# Altium integrated library URC_Lib.IntLib: 69 symbols
Pins are listed as number, name and electrical type; pins without a type are passive.

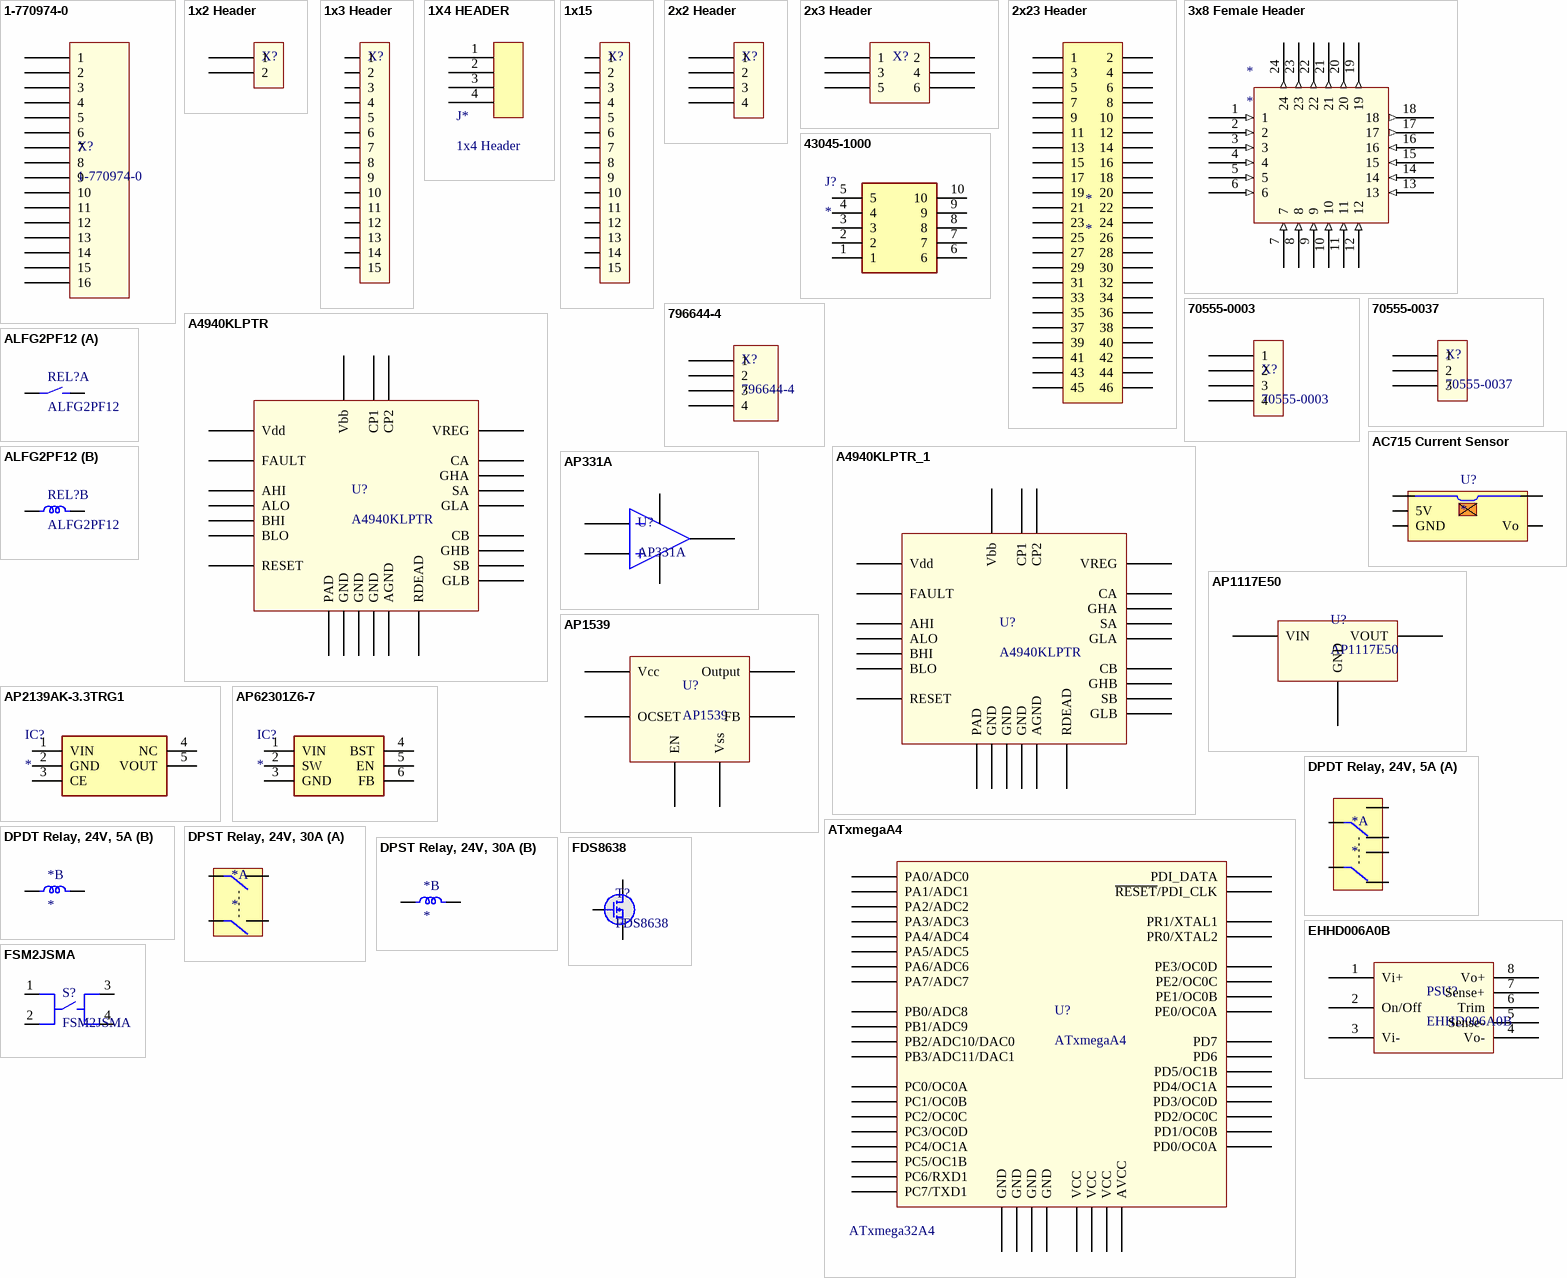
[diagram p0: symbols 1-770974-0 to FSM2JSMA]

## 1-770974-0
designator X?
Mini-Universal MATE-N-LOK, 16 pin; URL: http://search.digikey.com/us/en/products/1-770974-0/A32484-ND/697066
footprint 1-770974-0 (16 Pin Mini-Universal MATE-N-LOK)
pins: 1, 2, 3, 4, 5, 6, 7, 8, 9, 10, 11, 12, 13, 14, 15, 16

## 1x2 Header
designator X?, comment Header  (value not drawn)
1x2 Header
footprint 1x2 Header
pins: 1, 2
1 alternate drawing of the same symbol

## 1x3 Header
designator X?, comment Header  (value not drawn)
1x3 Header
footprint 1x15 Header
pins: 1, 2, 3, 4, 5, 6, 7, 8, 9, 10, 11, 12, 13, 14, 15

## 1X4 HEADER
designator J*, comment 1x4 Header
CONN HEADER VERT 4POS 2.54MM; Manufacturer: Würth Elektronik; Manufacturer Part Number: 61300411121; Value: 1x4 Header
footprint 1X4 HEADER
pins: 1, 2, 3, 4

## 1x15
designator X?, comment Header  (value not drawn)
1x3 Header
footprint 1x15 Header
pins: 1, 2, 3, 4, 5, 6, 7, 8, 9, 10, 11, 12, 13, 14, 15

## 2x2 Header
designator X?, comment Header  (value not drawn)
2x2 Header
footprint 2x2 Header
footprint 2x2 Header w/ division
pins: 1, 2, 3, 4
1 alternate drawing of the same symbol

## 2x3 Header
designator X?, comment Header  (value not drawn)
2x3 Header; Manufacturer 1: FCI; Manufacturer Part Number: 67996-406HLF; Description 1: FCI - 67996-406HLF - BOARD-BOARD CONNECTOR HEADER, 6 POSITION, 2ROW; Product Range: BergStik 67996 Series; Contact Termination Type: Through Hole; No. of Contacts: 6; Pitch Spacing: 2.54; No. of Rows: 2; Supplier 1: Newark; Supplier Part Number 1: 20M2191; RoHS: YES; Stock 1: 441; Pricing 1: 1=0.254, 10=0.218, 25=0.186, 50=0.178, 100=0.16, 250=0.153, 500=0.128, 1000=0.117 (USD); Gender: Header; Contact Plating: Tin Plated Contacts; ComponentLink1URL: http://www.farnell.com/datasheets/1876884.pdf; ComponentLink1Description: http://www.farnell.com/datasheets/1876884.pdf
footprint 2x3 Header
pins: 1, 2, 3, 4, 5, 6

## 2x23 Header
designator *
footprint 2X23 HEADER
pins: 1, 2, 3, 4, 5, 6, 7, 8, 9, 10, 11, 12, 13, 14, 15, 16, 17, 18, 19, 20, 21, 22, 23, 24, 25, 26, 27, 28, 29, 30, 31, 32, 33, 34, 35, 36, 37, 38, 39, 40, 41, 42, 43, 44, 45, 46

## 3x8 Female Header
designator *
footprint 3x8 Female Header (3x8 female header)
pins: 1 (in), 2 (in), 3 (in), 4 (in), 5 (in), 6 (in), 7 (in), 8 (in), 9 (in), 10 (in), 11 (in), 12 (in), 13 (in), 14 (in), 15 (in), 16 (in), 17 (out), 18 (out), 19 (out), 20 (out), 21 (out), 22 (out), 23 (out), 24 (out)

## 43045-1000
designator J?
Connector; Manufacturer_Name: Molex; Manufacturer_Part_Number: 43045-1000; Datasheet Link: https://componentsearchengine.com//43045-1000.pdf; Height: 8.47mm; Mouser2 Part Number: 538-43045-1000; Mouser2 Price/Stock: https://www.mouser.com/Search/Refine.aspx?Keyword=538-43045-1000
footprint 43045-1000
pins: 1, 2, 3, 4, 5, 6, 7, 8, 9, 10

## 70555-0003
designator X?
Molex, C-Grid SL 70555, 4 Pin; URL: http://search.digikey.com/us/en/products/70555-0003/WM4166-ND/1643400
footprint 70555-0003 (Molex C-Grid SL 70555, 4 Pin)
pins: 1, 2, 3, 4

## 70555-0037
designator X?
Molex, C-Grid SL 70555, 3 Pin; URL: http://search.digikey.com/us/en/products/70555-0037/WM4176-ND/1643410
footprint 70555-0037 (Molex C-Grid SL 70555, 3 Pin)
pins: 1, 2, 3

## 796644-4
designator X?
TE Connectivity, Termi-Blok, 4 Pin; URL: http://search.digikey.com/us/en/products/796644-4/A98250-ND/1827109
footprint 796644-4 (Termi-Blok, 4 Pin, R/A)
pins: 1, 2, 3, 4

## A4940KLPTR
designator U?
Full Bridge MOSFET Driver
footprint TSOP-24-TP (TSOP, 24-Leads, Body 7.8x4.4mm (max), Pitch 0.65mm, IPC Medium Density)
pins: 1 RESET, 2 GND, 3 GLB, 4 SB, 5 GHB, 6 CB, 7 VREG, 8 CA, 9 GHA, 10 SA, 11 GLA, 12 Vbb, 13 CP2, 14 CP1, 15 GND, 16 GND, 17 BLO, 18 BHI, 19 ALO, 20 AHI, 21 Vdd, 22 AGND, 23 RDEAD, 24 FAULT, 25 PAD

## A4940KLPTR_1
designator U?, comment A4940KLPTR
Full Bridge MOSFET Driver
footprint TSOP-24-TP (TSOP, 24-Leads, Body 7.8x4.4mm (max), Pitch 0.65mm, IPC Medium Density)
pins: 1 RESET, 2 GND, 3 GLB, 4 SB, 5 GHB, 6 CB, 7 VREG, 8 CA, 9 GHA, 10 SA, 11 GLA, 12 Vbb, 13 CP2, 14 CP1, 15 GND, 16 GND, 17 BLO, 18 BHI, 19 ALO, 20 AHI, 21 Vdd, 22 AGND, 23 RDEAD, 24 FAULT, 25 PAD

## AC715 Current Sensor
designator U?
Manufacturer Part Number: 1186; Supplier Unit Price 1: 9.95; Supplier Part Number 1: 1186; Supplier 1: Pololu
footprint AC715 Current Sensor
pins: 1, 2, 3 GND, 4 Vo, 5 5V

## ALFG2PF12
designator REL?
31A SPST 12V Relay; URL: http://search.digikey.com/us/en/products/ALFG2PF12/255-2638-ND/2125675
footprint ALFG2PF12
part A pins: 3, 4
part B pins: 1, 2

## AP331A
designator U?
2-36V Comparator; URL: http://search.digikey.com/us/en/products/AP331AWRG-7/AP331AWRGDICT-ND/2095606
footprint AP331AWR (SOT25R); pin to pad 1>3 3>1
pins: 1 In-, 2 GND, 3 In+, 4 OUT, 5 VCC

## AP1117E50
designator U?
5V 1A Linear Regulator; URL: https://www.digikey.com/product-detail/en/AP1117E50G-13/AP1117E50GDICT-ND/1301523
footprint AP1117 (SOT223-3L)
pins: GND, VIN, VOUT

## AP1539
designator U?
4A Switching Regulator
footprint AP1539-SOP8 (SOIC, 8-Leads, Body 4.9x3.9mm (max), Pitch 1.27mm, IPC Medium Density)
pins: EN, FB, OCSET, Output, Vcc, Vss

## AP2139AK-3.3TRG1
designator IC?
Integrated Circuit; Manufacturer_Name: Diodes Inc.; Manufacturer_Part_Number: AP2139AK-3.3TRG1; Height: 1.45mm
footprint AP2139AK-3.3TRG1 (SOT95P280X145-5N)
pins: 1 VIN, 2 GND, 3 CE, 4 NC, 5 VOUT

## AP62301Z6-7
designator IC?
Integrated Circuit; Manufacturer_Name: Diodes Inc.; Manufacturer_Part_Number: AP62301Z6-7; Datasheet Link: https://www.diodes.com/assets/Datasheets/AP62300_AP62301_AP62300T.pdf; Height: 0.6mm
footprint AP62301Z6-7 (SOTFL50P162X60-6N)
pins: 1 VIN, 2 SW, 3 GND, 4 BST, 5 EN, 6 FB

## ATxmegaA4
designator U?  Model: ATxmega32A4
URL: http://search.digikey.com/us/en/products/ATXMEGA32A4-AU/ATXMEGA32A4-AU-ND/1886270
footprint ATxmegaA4-TQFP44 (TQFP, 44-Leads, Body 12.3x12.3mm (max), Pitch 0.80mm, IPC Medium Density)
pins: 1 PA5/ADC5, 2 PA6/ADC6, 3 PA7/ADC7, 4 PB0/ADC8, 5 PB1/ADC9, 6 PB2/ADC10/DAC0, 7 PB3/ADC11/DAC1, 8 GND, 9 VCC, 10 PC0/OC0A, 11 PC1/OC0B, 12 PC2/OC0C, 13 PC3/OC0D, 14 PC4/OC1A, 15 PC5/OC1B, 16 PC6/RXD1, 17 PC7/TXD1, 18 GND, 19 VCC, 20 PD0/OC0A, 21 PD1/OC0B, 22 PD2/OC0C, 23 PD3/OC0D, 24 PD4/OC1A, 25 PD5/OC1B, 26 PD6, 27 PD7, 28 PE0/OC0A, 29 PE1/OC0B, 30 GND, 31 VCC, 32 PE2/OC0C, 33 PE3/OC0D, 34 PDI_DATA, 35 ~{RESET}/PDI_CLK, 36 PR0/XTAL2, 37 PR1/XTAL1, 38 GND, 39 AVCC, 40 PA0/ADC0, 41 PA1/ADC1, 42 PA2/ADC2, 43 PA3/ADC3, 44 PA4/ADC4

## DPDT Relay, 24V, 5A
designator *
Vender URL: https://www.digikey.com/product-detail/en/JW2SN-DC24V/255-1118-ND/251890
footprint JW2SN-DC24V (24V Relay by panasonic)
part A pins: 2, 3, 4, 5, 6, 7
part B pins: 1, 8

## DPST Relay, 24V, 30A
designator *
Vender URL: http://www.digikey.com/product-search/en?KeyWords=T92P7D12-24&WT.z_header=search_go
footprint T92 Series Relay
part A pins: 2, 4, 6, 8
part B pins: 0, 1

## EHHD006A0B
designator PSU?
12V DC-DC Converter, Eighth-Brick; Supplier 1: Digi-Key; Supplier 2: Digi-Key; Supplier Part Number 1: 555-1279-ND; Supplier Part Number 2: 555-1265-ND; URL: http://search.digikey.com/us/en/products/EHHD006A0B41Z/555-1265-ND/2704888
footprint EHHD006A0B
pins: 1 Vi+ (power), 2 On/Off, 3 Vi- (power), 4 Vo- (power), 5 Sense-, 6 Trim, 7 Sense+, 8 Vo+ (power)

## FDS8638
designator T?
Power N-Channel MOSFET
footprint FDS8638 (SOIC, 8-Leads, Body 5.0x4.0mm (max), Pitch 1.27mm, IPC Medium Density)
pins: D DRAIN, G GATE, S SOURCE

## FSM2JSMA
designator S?
Tactile Switch (OFF-MOM); Manufacturer 1: TE CONNECTIVITY / ALCOSWITCH; Description 1: TE CONNECTIVITY / ALCOSWITCH - FSM2JSMA - SWITCH, TACTILE, SPST-NO, 50mA, SMD; URL: http://search.digikey.com/us/en/products/FSM2JSMA/450-1130-ND/525819; Supplier 1: Newark; Supplier Part Number 1: 92F2864; RoHS: YES; Stock 1: 73; Pricing 1: 1=0.28, 10=0.262, 25=0.253, 50=0.244, 100=0.23, 250=0.217, 500=0.208, 1000=0.158 (USD); ComponentLink1URL: http://www.tycoelectronics.com/commerce/DocumentDelivery/DDEController?Action=showdoc&DocId=Catalog+Section%7F1308111-1_SWITCHES_CORE_PROGRAM_CATALOG%7F0308%7Fpdf%7FEnglish%7FENG_CS_1308111-1_SWITCHES_CORE_PROGRAM_CATALOG_0308.pdf%7F1825041-1; ComponentLink1Description: http://www.tycoelectronics.com/commerce/DocumentDelivery/DDEController?Action=showdoc&DocId=Catalog+Section%7F1308111-1_SWITCHES_CORE_PROGRAM_CATALOG%7F0308%7Fpdf%7FEnglish%7FENG_CS_1308111-1_SWITCHES_CORE_PROGRAM_CATALOG_0308.pdf%7F1825041-1; ComponentLink2URL: http://www.farnell.com/cad/1650702.pdf; ComponentLink2Description: http://www.farnell.com/cad/1650702.pdf; ComponentLink3URL: http://www.farnell.com/datasheets/1668117.pdf; ComponentLink3Description: http://www.farnell.com/datasheets/1668117.pdf; ComponentLink4URL: http://www.farnell.com/datasheets/921681.pdf; ComponentLink4Description: http://www.farnell.com/datasheets/921681.pdf; ComponentLink5URL: http://ecommas.tycoelectronics.com/commerce/DocumentDelivery/DDEController?Action=showdoc&DocId=Catalog+Page%7F1308390_0904_E3_E10%7Fn%2Fa%7Fpdf%7FEnglish%7FENG_CAT_1308390_0904_E3_E10_.pdf; ComponentLink5Description: http://ecommas.tycoelectronics.com/commerce/DocumentDelivery/DDEController?Action=showdoc&DocId=Catalog+Page%7F1308390_0904_E3_E10%7Fn%2Fa%7Fpdf%7FEnglish%7FENG_CAT_1308390_0904_E3_E10_.pdf; Manufacturer Part Number: FSM2JSMA
footprint FSM2JSMA (SPST OFF-MOM Switch)
pins: 1, 2, 3, 4
1 alternate drawing of the same symbol

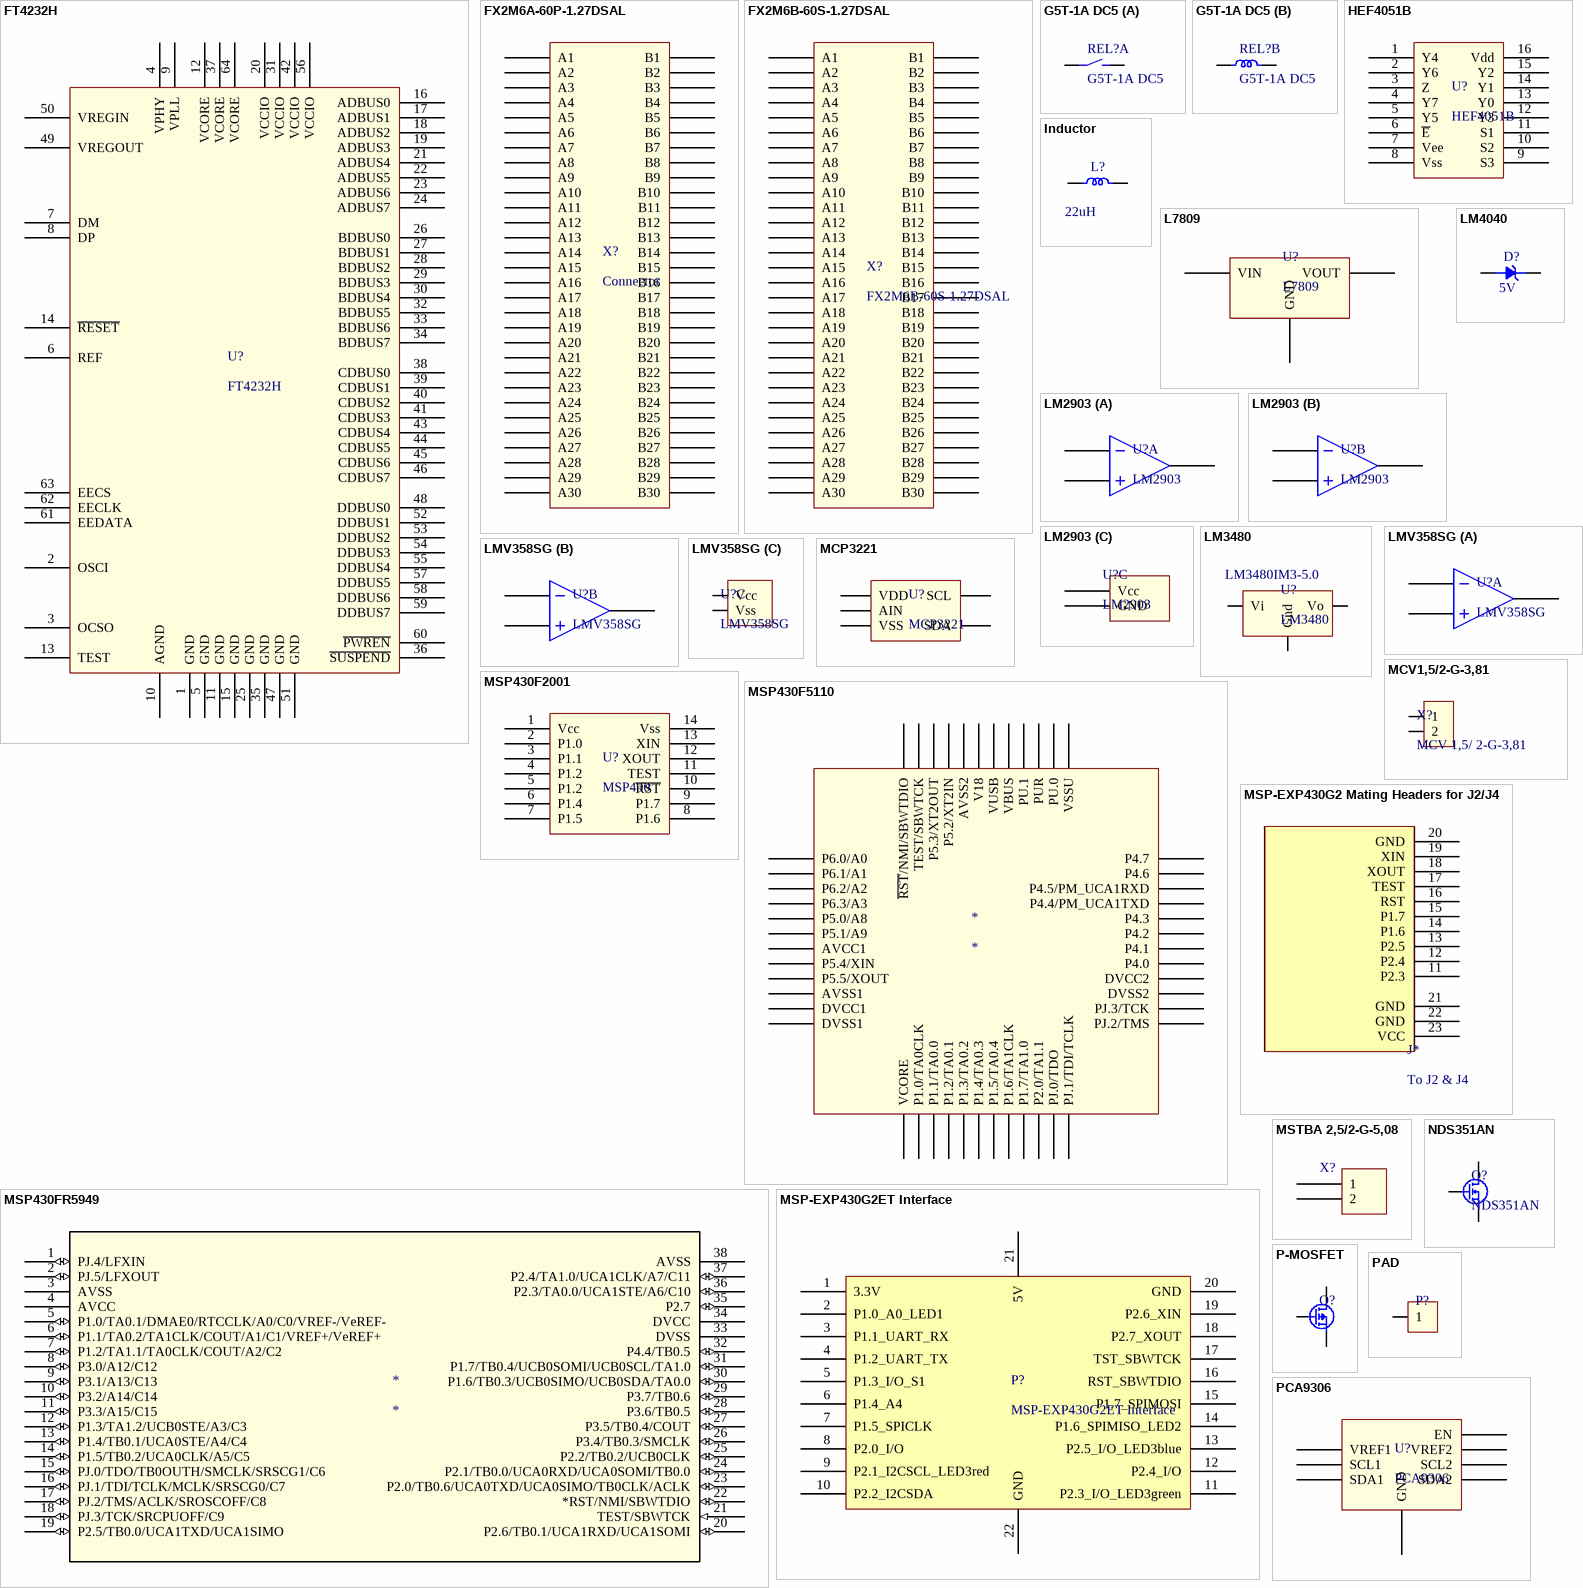
[diagram p1: symbols FT4232H to PCA9306]

## FT4232H
designator U?
FTDI USB Quad UART; URL: http://search.digikey.com/us/en/products/FT4232HL-REEL/768-1026-1-ND/1986059
footprint FT4232H-LQFP64 (TSQFP, 64-Leads, Body 12.2x12.2mm (max), Pitch 0.50mm, IPC Medium Density)
pins: 1 GND, 2 OSCI, 3 OCSO, 4 VPHY, 5 GND, 6 REF, 7 DM, 8 DP, 9 VPLL, 10 AGND, 11 GND, 12 VCORE, 13 TEST, 14 ~{RESET}, 15 GND, 16 ADBUS0, 17 ADBUS1, 18 ADBUS2, 19 ADBUS3, 20 VCCIO, 21 ADBUS4, 22 ADBUS5, 23 ADBUS6, 24 ADBUS7, 25 GND, 26 BDBUS0, 27 BDBUS1, 28 BDBUS2, 29 BDBUS3, 30 BDBUS4, 31 VCCIO, 32 BDBUS5, 33 BDBUS6, 34 BDBUS7, 35 GND, 36 ~{SUSPEND}, 37 VCORE, 38 CDBUS0, 39 CDBUS1, 40 CDBUS2, 41 CDBUS3, 42 VCCIO, 43 CDBUS4, 44 CDBUS5, 45 CDBUS6, 46 CDBUS7, 47 GND, 48 DDBUS0, 49 VREGOUT, 50 VREGIN, 51 GND, 52 DDBUS1, 53 DDBUS2, 54 DDBUS3, 55 DDBUS4, 56 VCCIO, 57 DDBUS5, 58 DDBUS6, 59 DDBUS7, 60 ~{PWREN}, 61 EEDATA, 62 EECLK, 63 EECS, 64 VCORE

## FX2M6A-60P-1.27DSAL
designator X?, comment Connector
60 Pin Mezzanine Connector (Header); URL: http://search.digikey.com/us/en/products/FX2M6A-60P-1.27DSAL(71)/H10516-ND/1024456
footprint FX2M6A-60P-1.27DSAL
pins: a1 A1, a2 A2, a3 A3, a4 A4, a5 A5, a6 A6, a7 A7, a8 A8, a9 A9, a10 A10, a11 A11, a12 A12, a13 A13, a14 A14, a15 A15, a16 A16, a17 A17, a18 A18, a19 A19, a20 A20, a21 A21, a22 A22, a23 A23, a24 A24, a25 A25, a26 A26, a27 A27, a28 A28, a29 A29, a30 A30, b1 B1, b2 B2, b3 B3, b4 B4, b5 B5, b6 B6, b7 B7, b8 B8, b9 B9, b10 B10, b11 B11, b12 B12, b13 B13, b14 B14, b15 B15, b16 B16, b17 B17, b18 B18, b19 B19, b20 B20, b21 B21, b22 B22, b23 B23, b24 B24, b25 B25, b26 B26, b27 B27, b28 B28, b29 B29, b30 B30

## FX2M6B-60S-1.27DSAL
designator X?
60 Pin Mezzanine Connector (Socket); URL: http://search.digikey.com/us/en/products/FX2M6B-60S-1.27DSAL(71)/H10519-ND/1024459
footprint FX2M6B-60S-1.27DSAL
pins: a1 A1, a2 A2, a3 A3, a4 A4, a5 A5, a6 A6, a7 A7, a8 A8, a9 A9, a10 A10, a11 A11, a12 A12, a13 A13, a14 A14, a15 A15, a16 A16, a17 A17, a18 A18, a19 A19, a20 A20, a21 A21, a22 A22, a23 A23, a24 A24, a25 A25, a26 A26, a27 A27, a28 A28, a29 A29, a30 A30, b1 B1, b2 B2, b3 B3, b4 B4, b5 B5, b6 B6, b7 B7, b8 B8, b9 B9, b10 B10, b11 B11, b12 B12, b13 B13, b14 B14, b15 B15, b16 B16, b17 B17, b18 B18, b19 B19, b20 B20, b21 B21, b22 B22, b23 B23, b24 B24, b25 B25, b26 B26, b27 B27, b28 B28, b29 B29, b30 B30

## G5T-1A DC5
designator REL?
5V 5A General Purpose Relay; URL: http://search.digikey.com/us/en/products/G5T-1A%20DC5/Z2774-ND/1731474
footprint G5T-1ADC5 (General purpose SPST-NO relay)
part A pins: 3, 4
part B pins: 1, 2

## HEF4051B
designator U?
1:8 Mux/Demux; URL: http://search.digikey.com/us/en/products/HEF4051BTT,118/568-1875-1-ND/805400
footprint TSOP-16 (TSOP, 16-Leads, Body 5.0x4.5mm (max), Pitch 0.65mm, IPC Medium Density)
footprint TSSOP-16 (TSSOP, 16-Leads, Body 5.10x4.5mm (max), Pitch 0.65mm, IPC Medium Density)
pins: 1 Y4, 2 Y6, 3 Z, 4 Y7, 5 Y5, 6 ~{E}, 7 Vee, 8 Vss, 9 S3, 10 S2, 11 S1, 12 Y3, 13 Y0, 14 Y1, 15 Y2, 16 Vdd
1 alternate drawing of the same symbol

## Inductor
designator L?  value 22uH  (hidden comment: Inductor)
footprint UP4B (Cooper Bussmann Power Inductor)
footprint INDUCTOR-WE-PD
footprint R0805 (Chip Resistor, 2-Leads, Body 2.0x1.5mm, IPC Medium Density)
pins: 1, 2

## L7809
designator U?
URL: http://search.digikey.com/us/en/products/L7809CD2T-TR/497-1176-1-ND/586176
footprint L7809CD2T-D2PAK (9V Regulator, D2PAK)
pins: GND, INPUT VIN, OUTPUT VOUT

## LM2903
designator U?
Dual comparator; URL: http://search.digikey.com/us/en/products/LM2903MX/LM2903MXFSCT-ND/2053100
footprint LM2903 (SOIC, 8-Leads, Body 5.0x4.0mm (max), Pitch 1.27mm, IPC Medium Density)
part A pins: 1 OUT1, 2 -, 3 +
part B pins: 5 +, 6 -, 7 OUT2
part C pins: 4 GND, 8 Vcc

## LM3480
designator U?  Manufacturer Part Number: LM3480IM3-5.0
5V, 0.1A Fixed LDO; Manufacturer 1: TEXAS INSTRUMENTS; Description 1: TEXAS INSTRUMENTS - LM3480IM3-5.0 - LDO VOLTAGE REGULATOR, 5V, 0.1A, 3-SOT-23; Input Voltage Min: 0; Input Voltage Max: 30; Output Current: 100; Dropout Voltage Vdo: 900; LDO Regulator Case Style: SOT-23; No. of Pins: 3; Supplier 1: Newark; Supplier Part Number 1: 83F3816; RoHS: NO; Stock 1: 132; Pricing 1: 1=1.24, 10=0.986, 100=0.757, 1000=0.529 (USD); Operating Temperature Min: -40 C; ComponentLink1URL: http://www.farnell.com/cad/1562346.zip; ComponentLink1Description: http://www.farnell.com/cad/1562346.zip; ComponentLink2URL: http://www.farnell.com/datasheets/1853525.pdf; ComponentLink2Description: http://www.farnell.com/datasheets/1853525.pdf
footprint LM4040-SOT23-3 (LM4040, Precision fixed/adjustable regulator); pin to pad 1>3 2>1 3>2
pins: 1 Gnd (power), 2 Vo (power), 3 Vi

## LM4040
designator D?  value 5V  (hidden comment: LM4040)
LM4040 fixed voltage reference
footprint LM4040-SOT23-3 (LM4040, Precision fixed/adjustable regulator)
pins: 1, 2

## LMV358SG
designator U?
Dual, Rail-To-Rail OpAmp; URL: http://search.digikey.com/us/en/products/LMV358SG-13/LMV358SG-13DICT-ND/2182572
footprint LMV358SG-SOIC8 (SOP, 8-Leads, Body 4.9x4.0mm (max), Pitch 1.27mm, IPC Medium Density)
part A pins: 1 OUT1, 2 -, 3 +
part B pins: 5 +, 6 -, 7 OUT2
part C pins: 4 Vss, 8 Vcc

## MCP3221
designator U?
MCP3221, 12 bit ADC, I2C
footprint MCP3221-SOT23-5 (MCP3221 12 bit ADC, SOT23-5)
pins: AIN, SCL, SDA, VDD, VSS

## MCV1,5/2-G-3,81
designator X?, comment MCV 1,5/ 2-G-3,81
Pheonix 2 pin connector header
footprint MCV1,5/2-G-3,81
pins: 1, 2

## MSP430F2001
designator U?, comment MSP430
MSP430F2001; URL: http://search.digikey.com/us/en/products/MSP430F2001IPWR/296-19686-1-ND/1045113
footprint TSOP-14 (TSOP, 14-Leads, Body 5.0x4.5mm (max), Pitch 0.65mm, IPC Medium Density)
pins: 1 Vcc, 2 P1.0, 3 P1.1, 4 P1.2, 5 P1.2, 6 P1.4, 7 P1.5, 8 P1.6, 9 P1.7, 10 ~{RST}, 11 TEST, 12 XOUT, 13 XIN, 14 Vss

## MSP430F5110
designator *
pins: 1 P6.0/A0, 2 P6.1/A1, 3 P6.2/A2, 4 P6.3/A3, 5 P5.0/A8, 6 P5.1/A9, 7 AVCC1, 8 P5.4/XIN, 9 P5.5/XOUT, 10 AVSS1, 11 DVCC1, 12 DVSS1, 13 VCORE, 14 P1.0/TA0CLK, 15 P1.1/TA0.0, 16 P1.2/TA0.1, 17 P1.3/TA0.2, 18 P1.4/TA0.3, 19 P1.5/TA0.4, 20 P1.6/TA1CLK, 21 P1.7/TA1.0, 22 P2.0/TA1.1, 23 PJ.0/TDO, 24 PJ.1/TDI/TCLK, 25 PJ.2/TMS, 26 PJ.3/TCK, 27 DVSS2, 28 DVCC2, 29 P4.0, 30 P4.1, 31 P4.2, 32 P4.3, 33 P4.4/PM_UCA1TXD, 34 P4.5/PM_UCA1RXD, 35 P4.6, 36 P4.7, 37 VSSU, 38 PU.0, 39 PUR, 40 PU.1, 41 VBUS, 42 VUSB, 43 V18, 44 AVSS2, 45 P5.2/XT2IN, 46 P5.3/XT2OUT, 47 TEST/SBWTCK, 48 ~{RST}/NMI/SBWTDIO

## MSP430FR5949
designator *
footprint MSP430FR5949
pins: 1 PJ.4/LFXIN (io), 2 PJ.5/LFXOUT (io), 3 AVSS (power), 4 AVCC (power), 5 P1.0/TA0.1/DMAE0/RTCCLK/A0/C0/VREF-/VeREF- (io), 6 P1.1/TA0.2/TA1CLK/COUT/A1/C1/VREF+/VeREF+ (io), 7 P1.2/TA1.1/TA0CLK/COUT/A2/C2 (io), 8 P3.0/A12/C12 (io), 9 P3.1/A13/C13 (io), 10 P3.2/A14/C14 (io), 11 P3.3/A15/C15 (io), 12 P1.3/TA1.2/UCB0STE/A3/C3 (io), 13 P1.4/TB0.1/UCA0STE/A4/C4 (io), 14 P1.5/TB0.2/UCA0CLK/A5/C5 (io), 15 PJ.0/TDO/TB0OUTH/SMCLK/SRSCG1/C6 (io), 16 PJ.1/TDI/TCLK/MCLK/SRSCG0/C7 (io), 17 PJ.2/TMS/ACLK/SROSCOFF/C8 (io), 18 PJ.3/TCK/SRCPUOFF/C9 (io), 19 P2.5/TB0.0/UCA1TXD/UCA1SIMO (io), 20 P2.6/TB0.1/UCA1RXD/UCA1SOMI (io), 21 TEST/SBWTCK (in), 22 *RST/NMI/SBWTDIO (io), 23 P2.0/TB0.6/UCA0TXD/UCA0SIMO/TB0CLK/ACLK (io), 24 P2.1/TB0.0/UCA0RXD/UCA0SOMI/TB0.0 (io), 25 P2.2/TB0.2/UCB0CLK (io), 26 P3.4/TB0.3/SMCLK (io), 27 P3.5/TB0.4/COUT (io), 28 P3.6/TB0.5 (io), 29 P3.7/TB0.6 (io), 30 P1.6/TB0.3/UCB0SIMO/UCB0SDA/TA0.0 (io), 31 P1.7/TB0.4/UCB0SOMI/UCB0SCL/TA1.0 (io), 32 P4.4/TB0.5 (io), 33 DVSS (power), 34 DVCC (power), 35 P2.7 (io), 36 P2.3/TA0.0/UCA1STE/A6/C10 (io), 37 P2.4/TA1.0/UCA1CLK/A7/C11 (io), 38 AVSS (power)

## MSP-EXP430G2 Mating Headers for J2/J4
designator J*, comment To J2 & J4
Female Mating Headers for MSP-EXP430G2 J2 & J4 / (can use Würth Elektronik 61301011121 and 61300311121); Manufacturer: URC; Manufacturer Part Number: N/A; Value: N/A
footprint MSP-EXP430G2 Mating Headers for J2/J4 (Female Mating Headers for MSP-EXP430G2 J2 & J4)
pins: 11 P2.3, 12 P2.4, 13 P2.5, 14 P1.6, 15 P1.7, 16 RST, 17 TEST, 18 XOUT, 19 XIN, 20 GND, 21 GND, 22 GND, 23 VCC

## MSP-EXP430G2ET Interface
designator P?
MSP-EXP430G2ET Interface Headers [x2 SSQ-110-03-F-S  (1x10, 2.54mm, socket)] [x2 SSQ-102-03-G-S (1x2, 2.54mm, socket)]; Link: *
footprint MSP-EXP430G2ET Interface
pins: 1 3.3V (power), 2 P1.0_A0_LED1, 3 P1.1_UART_RX, 4 P1.2_UART_TX, 5 P1.3_I/O_S1, 6 P1.4_A4, 7 P1.5_SPICLK, 8 P2.0_I/O, 9 P2.1_I2CSCL_LED3red, 10 P2.2_I2CSDA, 11 P2.3_I/O_LED3green, 12 P2.4_I/O, 13 P2.5_I/O_LED3blue, 14 P1.6_SPIMISO_LED2, 15 P1.7_SPIMOSI, 16 RST_SBWTDIO, 17 TST_SBWTCK, 18 P2.7_XOUT, 19 P2.6_XIN, 20 GND (power), 21 5V, 22 GND

## MSTBA 2,5/2-G-5,08
designator X?, comment Connector  (value not drawn)
Phoenix MSTBA 2 Pin; URL: http://search.digikey.com/us/en/products/1755736/277-1150-ND/260518
footprint MSTBA-2-0.2 (Phoenix MSTBA 2 Pin 0.2" Pitch)
footprint MSTBA-2-0.2-VERT (Phoenix MSTBA 2 Pin 0.2" Pitch Vertical)
pins: 1, 2

## NDS351AN
designator Q?
1.4A, 30V, N-Channel, MOSFET
footprint NDS351AN (SOT23, 3-Leads, Body 3.0x2.6mm (max), Pitch 0.95mm, IPC Medium Density)
pins: D DRAIN, G GATE, S SOURCE

## P-MOSFET
designator Q?  (value not drawn)
P-Channel MOSFET
footprint FDS4435BZ (FDS4435BZ P Channel MOSFET, 8-SOICN)
pins: D DRAIN, G GATE, S SOURCE

## PAD
designator P?, comment Pad  (value not drawn)
footprint PAD-60 (60mil diameter pad)
footprint PAD-12 AWG (80.8mil diameter pad)
pins: 1

## PCA9306
designator U?
PCA9306, Bidirectional level translator
footprint PCA9306-SO8 (PCA9306, Bidirection level translator)
pins: EN, GND, SCL1, SCL2, SDA1, SDA2, VREF1, VREF2
1 alternate drawing of the same symbol

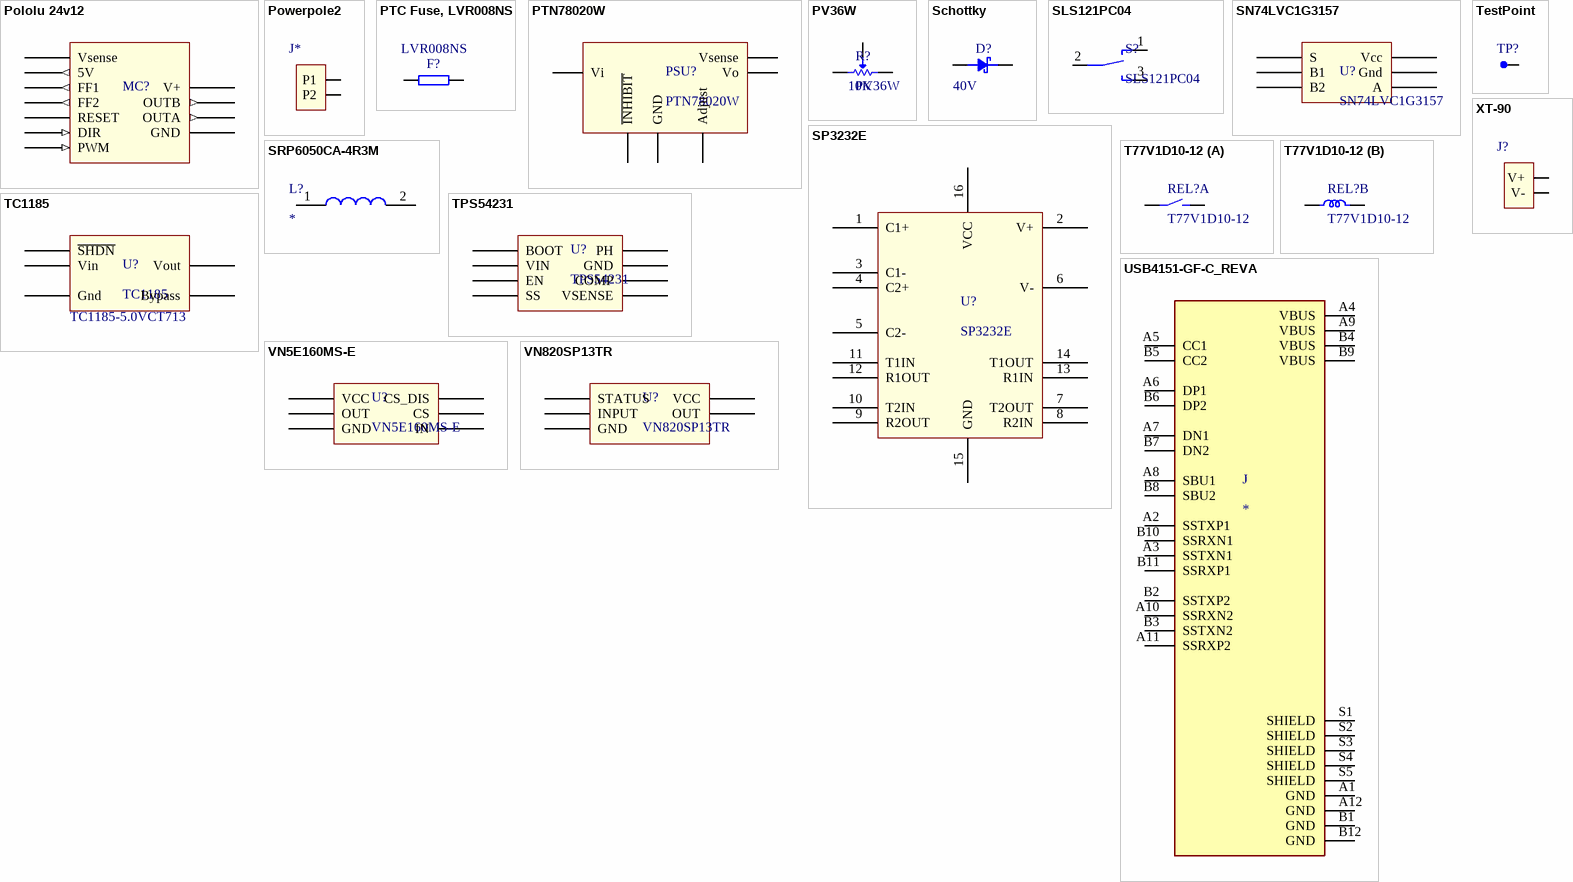
[diagram p2: symbols Pololu 24v12 to XT-90]

## Pololu 24v12
designator MC?, comment Motor Controller  (value not drawn)
Pololu 24v12 Motor Driver
footprint Pololu 24v12 (Pololu 24v12 Motor Driver)
pins: 5V (out), DIR (in), FF1 (out), FF2 (out), GND (power), OUTA (out), OUTB (out), PWM (in), RESET, V+ (power), V+_SENSE Vsense

## Powerpole2
designator J*
Set of 2 powerpoles (in a block)
footprint PowerPole2-VertAligned (Vertical mounting pins spaced for a block of 2 powerpoles. Both powerpoles are oriented the same direction)
pins: 1 P1 (power), 2 P2 (power)

## PTC Fuse, LVR008NS
designator F?  Manufacturer Part Number: LVR008NS  (hidden comment: PTC Fuse, LVR008NS)
Generic Fuse; Manufacturer 1: TE CONNECTIVITY / RAYCHEM; Description 1: TE CONNECTIVITY / RAYCHEM - LVR008NS - FUSE, PTC RESET, 240V, 80mA, RADIAL; Product Range: PolySwitch LVR Series; Holding Current: 80; Tripping Current: 190; Voltage Rating: 240; Thermistor Mounting: Through Hole; External Depth: 4.6; Supplier 1: Newark; Supplier Part Number 1: 45P7788; RoHS: YES; Stock 1: 919; Pricing 1: 1=0.46, 10=0.46, 100=0.409, 500=0.369, 1000=0.318, 2000=0.312, 5000=0.29, 10000=0.247 (USD); Operating Temperature Min: -40 C; ComponentLink1URL: http://www.farnell.com/datasheets/1902602.pdf; ComponentLink1Description: http://www.farnell.com/datasheets/1902602.pdf
footprint LVR008NS - Resettable Fuse (5x20mm Fuse Holder)
pins: 1, 2

## PTN78020W
designator PSU?
Adjustable, non-isolating DC-DC converter
footprint PTN78020 (DC-DC Non-isolating converter)
pins: GND, INHIBIT ~{INHIBIT}, Rset Adjust, VIN Vi, vo Vo, Vsense

## PV36W
designator R?  value 10K
25 turn potentiometer
footprint PV36W (PV36W, verticla mount potentiometer)
pins: 1, 2, 3

## Schottky
designator D?, comment value 40V  (hidden comment: Shottky)
footprint SCHOTTKY-B220/A (Schotty Diode)
pins: 1, 2

## SLS121PC04
designator S?
SPDT Switch; URL: http://search.digikey.com/us/en/products/SLS121PC04/450-1598-ND/1202217
footprint SLS121PC04 (SPDT Slide Switch)
pins: 1, 2, 3

## SN74LVC1G3157
designator U?
2x1 analog mux/demux; URL: http://search.digikey.com/us/en/products/SN74LVC1G3157DBVR/296-14908-1-ND/562548
footprint SN74LVC1G3157-SOT23-6 (2x1 switch mux/demux)
pins: 1 B2, 2 Gnd, 3 B1, 4 A, 5 Vcc, 6 S

## SP3232E
designator U?
RS232 Transceiver; URL: http://search.digikey.com/us/en/products/SP3232ECA-L/1016-1101-5-ND/2411033
footprint SP3232E-SSOP16 (SOP, 16-Leads, Body 6.5x5.6mm (max), Pitch 0.65mm, IPC Medium Density)
pins: 1 C1+, 2 V+, 3 C1-, 4 C2+, 5 C2-, 6 V-, 7 T2OUT, 8 R2IN, 9 R2OUT, 10 T2IN, 11 T1IN, 12 R1OUT, 13 R1IN, 14 T1OUT, 15 GND, 16 VCC
1 alternate drawing of the same symbol

## SRP6050CA-4R3M
designator L?
Inductor; Manufacturer_Name: Bourns; Manufacturer_Part_Number: SRP6050CA-4R3M; Datasheet Link: https://www.bourns.com/docs/Product-Datasheets/SRP6050CA.pdf; Height: 5mm
footprint SRP6050CA-4R3M
pins: 1, 2

## T77V1D10-12
designator REL?
12V 10A General Purpose Relay; URL: http://search.digikey.com/us/en/products/T77V1D10-12/T77V1D10-12-ND/1427693
footprint T77V1D10-12
part A pins: 3, 4
part B pins: 1, 2

## TC1185
designator U?  Part Number: TC1185-5.0VCT713
TC1185 LDO Regulator
footprint TC1185-SOT23-5 (TC1185, LDO Regulator)
pins: BYPASS Bypass, GND Gnd, SHDN ~{SHDN}, VIN Vin, VOUT Vout

## TestPoint
designator TP?, comment Test Point  (value not drawn)
footprint TP1 (Test Point)
pins: 1

## TPS54231
designator U?
2A Switching Regulator; URL: http://search.digikey.com/us/en/products/TPS54231DR/296-23844-1-ND/1960951
footprint TPS54231-SOIC8 (SOIC, 8-Leads, Body 5.0x4.0mm (max), Pitch 1.27mm, IPC Medium Density)
pins: BOOT, COMP, EN, GND, PH, SS, VIN, VSENSE

## USB4151-GF-C_REVA
designator J
USB Type C 3.1 vertical surface mount connector; MP: USB4151-GF-C; MF: Global Connector Technology; Package: None; Availability: Unavailable; SnapEDA_Link: https://www.snapeda.com/parts/USB4151-GF-C/Global%20Connector%20Technology/view-part/4594022/?ref=snap; Value: *; Price: None
footprint GCT_USB4151-GF-C_REVA
pins: A1 GND (power), A2 SSTXP1, A3 SSTXN1, A4 VBUS (power), A5 CC1, A6 DP1, A7 DN1, A8 SBU1, A9 VBUS (power), A10 SSRXN2, A11 SSRXP2, A12 GND (power), B1 GND (power), B2 SSTXP2, B3 SSTXN2, B4 VBUS (power), B5 CC2, B6 DP2, B7 DN2, B8 SBU2, B9 VBUS (power), B10 SSRXN1, B11 SSRXP1, B12 GND (power), S1 SHIELD, S2 SHIELD, S3 SHIELD, S4 SHIELD, S5 SHIELD

## VN5E160MS-E
designator U?
Single channel high-side MOSFET driver
footprint VN5E160MS-E (SOIC, 8-Leads, Body 5.0x4.0mm (max), Pitch 1.27mm, IPC Medium Density)
pins: CS, CS_DIS, GND, IN, OUT, VCC

## VN820SP13TR
designator U?
IC DRVR HISIDE 9A AUTO POWERSO10; URL: http://search.digikey.com/us/en/products/VN820SP13TR/497-3298-1-ND/654685
footprint VN820SP13TR (PowerSO-10)
pins: GND, INPUT, OUT, STATUS, VCC

## XT-90
designator J?
XT 90 connector. Footprint is for attaching to through hole PCB
footprint XT90 Through (Through hole footprint for XT90)
pins: 1 V+ (power), 2 V- (power)